# Altium footprint library Horizont_11_12_2017.PcbLib: 257 footprints (part 6 of 17)
Each footprint in its own frame and in the unit in brackets; x right, y up, seen from the top. Pads: shape width x height; smd on the part's side, far side on the other; paste and mask are expansions set on the pad; w line width, h text height; cw(c..) or ccw(c..) is an arc to the next point about the centre after c.
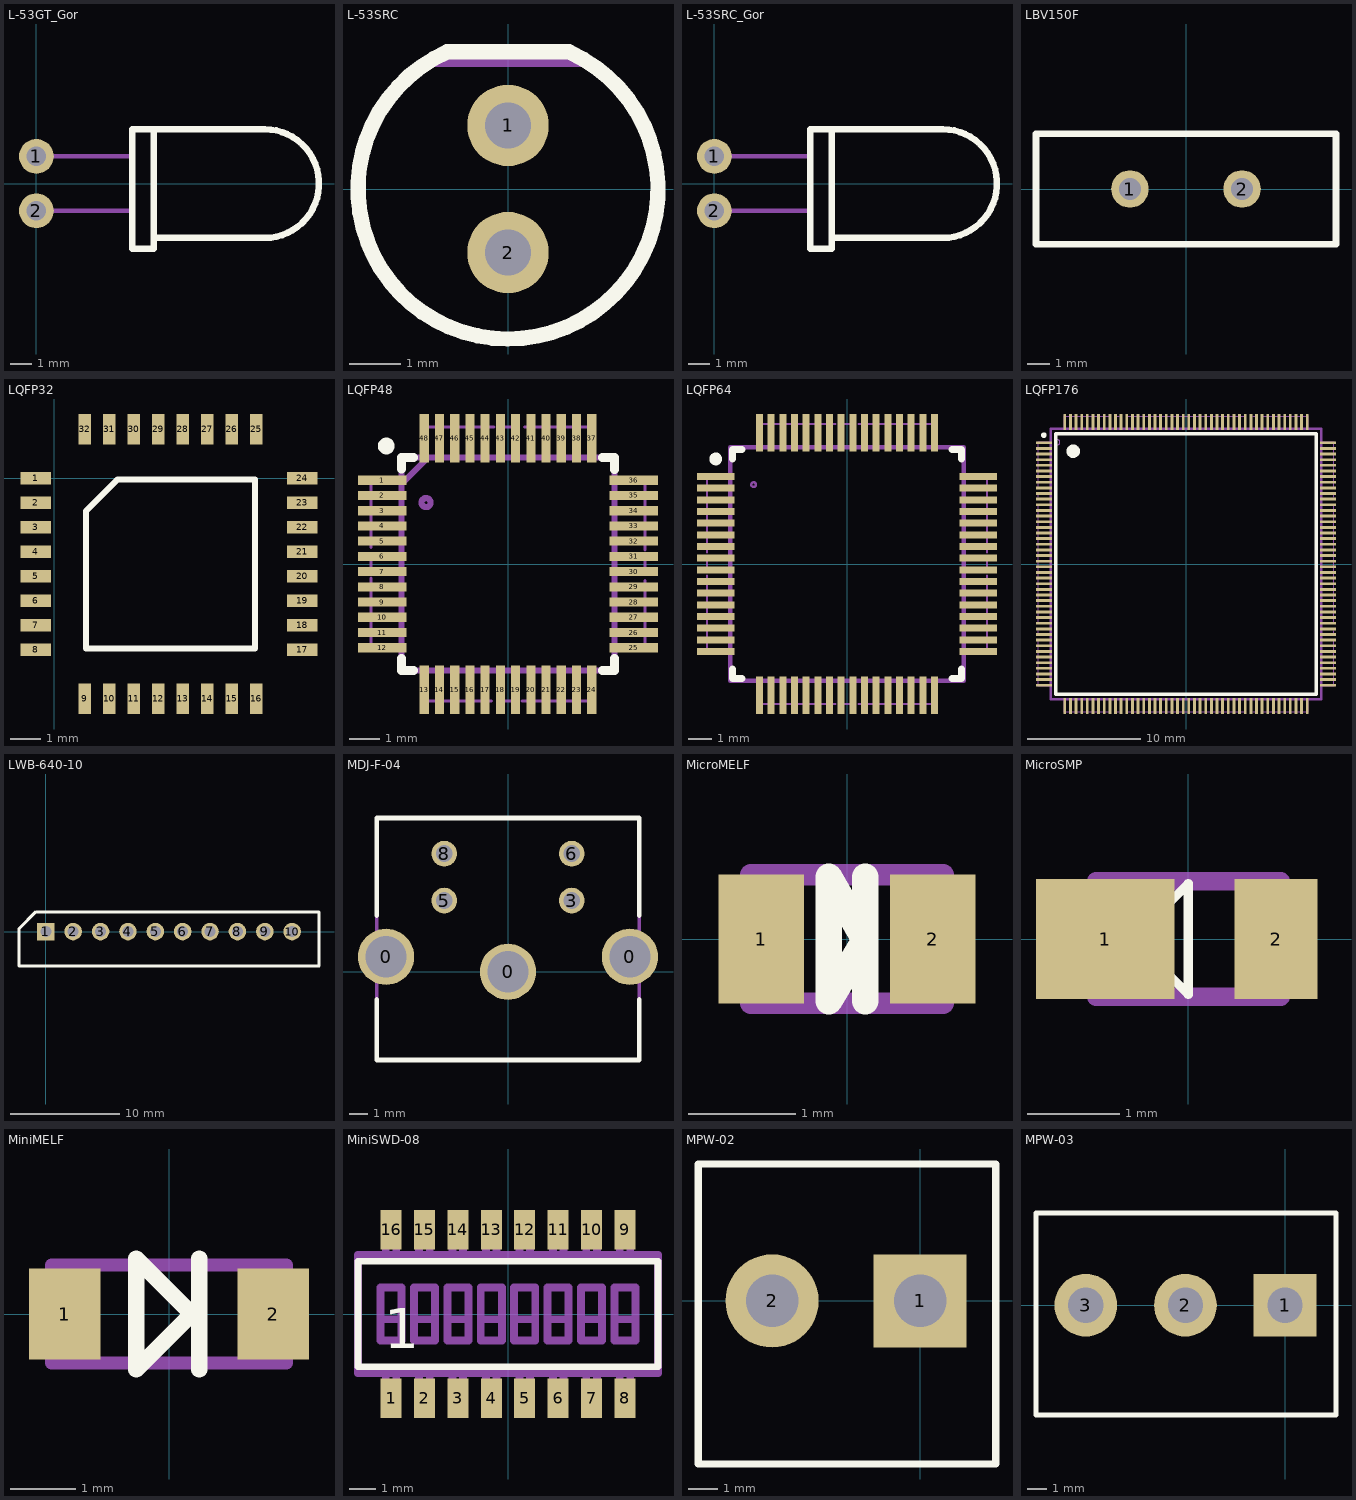
[diagram p5: the footprints below, top view; thin cyan lines are the x and y axes]

## L-53GT_Gor [mm]
height 6
pads (2):
  round 1.6 hole 0.9 unplated: 1(0,1.25) 2(0,-1.25)
Top Overlay:
  lines w0.3: 4.4,-1.3 4.4,-1.25 ; 5.4,-2.5 5.4,2.5 ; 5.4,-2.5 10.5,-2.5 ccw(c10.5,0) 10.5,2.5 5.4,2.5 ; 5.4,-2.5 5.4,-3 4.4,-3 4.4,2.5 5.4,2.5
Mechanical 1:
  lines w0.2: 0,-1.25 4.4,-1.25 4.4,-1.3 ; 0,1.25 4.4,1.25 ; 5.4,-2.5 5.4,-3 4.4,-3 4.4,2.5 5.4,2.5 ; 5.4,-2.5 10.5,-2.5 ccw(c10.5,0) 10.5,2.5 5.4,2.5 ; 5.4,-2.5 5.4,2.5
  text "+" at 3.2,-2.5 h1.5
  text ".Designator" at 6.5,-0.5 h1.5
3D body "L-53SGT_gor.stp": height 5.95, standoff -2.95, extent -0.25,-2.5 13.1,2.95

## L-53SRC [mm]
height 11
pads (2):
  round 1.6 hole 0.9 unplated: 1(0,1.25) 2(0,-1.25)
Top Overlay:
  lines w0.3: -1.2,2.7 1.2,2.7 ; -1.198,2.696 ccw(c0,0) 1.217,2.687
Mechanical 1:
  lines w0.2: -1.608,2.473 ccw(c0,0) 1.608,2.473 ; -1.608,2.5 1.608,2.5
  text ".Designator" at -3.2,3.55 h1.5
  text "+" at -0.4,-1.7 h1.5
3D body "L-53SRC.stp": height 11.2, standoff -3, extent -2.949,-2.95 2.949,2.5

## L-53SRC_Gor [mm]
height 6
pads (2):
  round 1.6 hole 0.9 unplated: 1(0,1.25) 2(0,-1.25)
Top Overlay:
  lines w0.3: 4.4,-1.3 4.4,-1.25 ; 5.4,-2.5 5.4,2.5 ; 5.4,-2.5 10.5,-2.5 ccw(c10.5,0) 10.5,2.5 5.4,2.5 ; 5.4,-2.5 5.4,-3 4.4,-3 4.4,2.5 5.4,2.5
Mechanical 1:
  lines w0.2: 0,-1.25 4.4,-1.25 4.4,-1.3 ; 0,1.25 4.4,1.25 ; 5.4,-2.5 5.4,-3 4.4,-3 4.4,2.5 5.4,2.5 ; 5.4,-2.5 10.5,-2.5 ccw(c10.5,0) 10.5,2.5 5.4,2.5 ; 5.4,-2.5 5.4,2.5
  text "+" at 3.2,-2.5 h1.5
  text ".Designator" at 6.5,-0.5 h1.5
3D body "L-53SRC_gor.stp": height 5.95, standoff -2.95, extent -0.25,-2.5 13.1,2.95

## LBV150F [mm]
height 14.5
pads (2):
  round 1.7 hole 1: 1(-2.54,0) 2(2.54,0)
Top Overlay:
  lines w0.3: -6.8,-2.5 6.8,-2.5 6.8,2.5 -6.8,2.5 -6.8,-2.5
Mechanical 1:
  circle w0.1: c-2.55,-0.25 r0.1
  lines w0.254: -6.8,-2.5 6.8,-2.5 6.8,2.5 -6.8,2.5 -6.8,-2.5
  text ".Designator" at -1.75,-0.4 h1.5
3D body "LBV150F.stp": height 13.5, standoff -3, extent -6.75,-2.5 6.75,2.5

## LQFP32 [mm]
pads (32):
  rect 1x0.4 smd: 1(-0.6,0) 2(-0.6,-0.8) 3(-0.6,-1.6) 4(-0.6,-2.4) 5(-0.6,-3.2) 6(-0.6,-4) 7(-0.6,-4.8) 8(-0.6,-5.6) 17(8.1,-5.6) 18(8.1,-4.8) 19(8.1,-4) 20(8.1,-3.2) 21(8.1,-2.4) 22(8.1,-1.6) 23(8.1,-0.8) 24(8.1,0)
  rect 0.4x1 smd: 9(1,-7.2) 10(1.8,-7.2) 11(2.6,-7.2) 12(3.4,-7.2) 13(4.2,-7.2) 14(5,-7.2) 15(5.8,-7.2) 16(6.6,-7.2) 25(6.6,1.6) 26(5.8,1.6) 27(5,1.6) 28(4.2,1.6) 29(3.4,1.6) 30(2.6,1.6) 31(1.8,1.6) 32(1,1.6)
Top Overlay:
  lines w0.2: 1.035,-5.565 6.565,-5.565 6.565,-0.035 2.07,-0.035 1.035,-1.07 1.035,-5.565
3D body "User Library-sot358-1.STEP": height 1.73, standoff 0.27, extent -0.739,-7.334 8.339,1.744

## LQFP48 [mm]
height 1.6
pads (48):
  rect 1.6x0.3 smd: 1(-4.125,2.75) 2(-4.125,2.25) 3(-4.125,1.75) 4(-4.125,1.25) 5(-4.125,0.75) 6(-4.125,0.25) 7(-4.125,-0.25) 8(-4.125,-0.75) 9(-4.125,-1.25) 10(-4.125,-1.75) 11(-4.125,-2.25) 12(-4.125,-2.75) 25(4.125,-2.75) 26(4.125,-2.25) 27(4.125,-1.75) 28(4.125,-1.25) 29(4.125,-0.75) 30(4.125,-0.25) 31(4.125,0.25) 32(4.125,0.75) 33(4.125,1.25) 34(4.125,1.75) 35(4.125,2.25) 36(4.125,2.75)
  rect 0.3x1.6 smd: 13(-2.75,-4.125) 14(-2.25,-4.125) 15(-1.75,-4.125) 16(-1.25,-4.125) 17(-0.75,-4.125) 18(-0.25,-4.125) 19(0.25,-4.125) 20(0.75,-4.125) 21(1.25,-4.125) 22(1.75,-4.125) 23(2.25,-4.125) 24(2.75,-4.125) 37(2.75,4.125) 38(2.25,4.125) 39(1.75,4.125) 40(1.25,4.125) 41(0.75,4.125) 42(0.25,4.125) 43(-0.25,4.125) 44(-0.75,4.125) 45(-1.25,4.125) 46(-1.75,4.125) 47(-2.25,4.125) 48(-2.75,4.125)
Top Overlay:
  circle w0.3: c-4,3.875 r0.125
  lines w0.3: -3.5,-3.1 -3.5,-3.5 -3.1,-3.5 ; -3.5,3.125 -3.5,3.5 -3.1,3.5 ; 3.1,-3.5 3.5,-3.5 3.5,-3.1 ; 3.1,3.5 3.5,3.5 3.5,3.1
Mechanical 1:
  circle w0.2: c-2.69,2.016 r0.15
  lines w0.1: -4.5,-2.75 -4.5,-0.46 ; -4.5,-0.085 -4.5,0.165 ; -4.5,0.54 -4.5,2.75 ; -2.75,-4.5 -0.54,-4.5 ; -2.75,4.5 -0.46,4.5 ; -0.165,-4.5 0.085,-4.5 ; -0.085,4.5 0.165,4.5 ; 0.46,-4.5 2.75,-4.5 ; 0.54,4.5 2.75,4.5 ; 4.5,-2.75 4.5,-0.54 ; 4.5,-0.165 4.5,0.085 ; 4.5,0.46 4.5,2.75
  lines w0.2: -4.5,-2.75 -3.5,-2.75 ; -4.5,2.75 -3.5,2.75 ; -3.5,-0.1 -3.5,0.1 ; -3.5,2.625 -2.75,3.375 ; -2.75,-4.5 -2.75,-3.5 ; -2.75,3.5 -2.75,4.5 ; 2.75,-4.5 2.75,-3.5 ; 2.75,3.5 2.75,4.5 ; 3.5,-2.75 4.5,-2.75 ; 3.5,2.75 4.5,2.75 ; -3.5,-3.5 3.5,-3.5 3.5,3.5 -3.5,3.5 -3.5,-3.5
  text ".Comment" at -2.33,-1.3 h1.5
  text ".Designator" at -1.625,0.625 h1.5
  text "48" at -2.413,2.159 h1.5
3D body "LQFP48.STEP": height 1.46, standoff -0.04, extent -4.5,-4.5 4.5,4.5

## LQFP64 [mm]
height 1.6
pads (64):
  rect 1.6x0.3 smd: 1(-5.625,3.75) 2(-5.625,3.25) 3(-5.625,2.75) 4(-5.625,2.25) 5(-5.625,1.75) 6(-5.625,1.25) 7(-5.625,0.75) 8(-5.625,0.25) 9(-5.625,-0.25) 10(-5.625,-0.75) 11(-5.625,-1.25) 12(-5.625,-1.75) 13(-5.625,-2.25) 14(-5.625,-2.75) 15(-5.625,-3.25) 16(-5.625,-3.75) 33(5.625,-3.75) 34(5.625,-3.25) 35(5.625,-2.75) 36(5.625,-2.25) 37(5.625,-1.75) 38(5.625,-1.25) 39(5.625,-0.75) 40(5.625,-0.25) 41(5.625,0.25) 42(5.625,0.75) 43(5.625,1.25) 44(5.625,1.75) 45(5.625,2.25) 46(5.625,2.75) 47(5.625,3.25) 48(5.625,3.75)
  rect 0.3x1.6 smd: 17(-3.75,-5.625) 18(-3.25,-5.625) 19(-2.75,-5.625) 20(-2.25,-5.625) 21(-1.75,-5.625) 22(-1.25,-5.625) 23(-0.75,-5.625) 24(-0.25,-5.625) 25(0.25,-5.625) 26(0.75,-5.625) 27(1.25,-5.625) 28(1.75,-5.625) 29(2.25,-5.625) 30(2.75,-5.625) 31(3.25,-5.625) 32(3.75,-5.625) 49(3.75,5.625) 50(3.25,5.625) 51(2.75,5.625) 52(2.25,5.625) 53(1.75,5.625) 54(1.25,5.625) 55(0.75,5.625) 56(0.25,5.625) 57(-0.25,5.625) 58(-0.75,5.625) 59(-1.25,5.625) 60(-1.75,5.625) 61(-2.25,5.625) 62(-2.75,5.625) 63(-3.25,5.625) 64(-3.75,5.625)
Top Overlay:
  circle w0.3: c-5.625,4.5 r0.125
  lines w0.3: -4.9,-4.5 -4.9,-4.9 -4.5,-4.9 ; -4.9,4.5 -4.9,4.9 -4.5,4.9 ; 4.5,-4.9 4.9,-4.9 4.9,-4.5 ; 4.5,4.9 4.9,4.9 4.9,4.5
Mechanical 1:
  circle w0.1: c-4,3.4 r0.1
  lines w0.1: -6,-3.75 -6,-0.5 ; -6,-0.125 -6,0.125 ; -6,0.5 -6,3.75 ; -3.75,-6 -0.5,-6 ; -3.75,6 -0.5,6 ; -0.125,-6 0.125,-6 ; -0.125,6 0.125,6 ; 0.5,-6 3.75,-6 ; 0.5,6 3.75,6 ; 6,-3.75 6,-0.5 ; 6,-0.125 6,0.125 ; 6,0.5 6,3.75
  lines w0.2: -6,-3.75 -5,-3.75 ; -6,3.75 -5,3.75 ; -3.75,-6 -3.75,-5 ; -3.75,5 -3.75,6 ; 3.75,-6 3.75,-5 ; 3.75,5 3.75,6 ; 5,-3.75 6,-3.75 ; 5,3.75 6,3.75 ; -5,-5 -5,5 5,5 5,-5 -5,-5
  text ".Designator" at -1.49,0.65 h1.5
  text ".Comment" at -3.08,-1.05 h1.5
  text "64" at -3.429,3.429 h1.5
3D body "S-PQFP-G64h1_45.stp": height 1.47, standoff 0, extent -6,-6 6,6

## LQFP176 [mm]
height 1.6
pads (176):
  rect 1.4x0.25 smd: 1(-12.6,10.75) 2(-12.6,10.25) 3(-12.6,9.75) 4(-12.6,9.25) 5(-12.6,8.75) 6(-12.6,8.25) 7(-12.6,7.75) 8(-12.6,7.25) 9(-12.6,6.75) 10(-12.6,6.25) 11(-12.6,5.75) 12(-12.6,5.25) 13(-12.6,4.75) 14(-12.6,4.25) 15(-12.6,3.75) 16(-12.6,3.25) 17(-12.6,2.75) 18(-12.6,2.25) 19(-12.6,1.75) 20(-12.6,1.25) 21(-12.6,0.75) 22(-12.6,0.25) 23(-12.6,-0.25) 24(-12.6,-0.75) 25(-12.6,-1.25) 26(-12.6,-1.75) 27(-12.6,-2.25) 28(-12.6,-2.75) 29(-12.6,-3.25) 30(-12.6,-3.75) 31(-12.6,-4.25) 32(-12.6,-4.75) 33(-12.6,-5.25) 34(-12.6,-5.75) 35(-12.6,-6.25) 36(-12.6,-6.75) 37(-12.6,-7.25) 38(-12.6,-7.75) 39(-12.6,-8.25) 40(-12.6,-8.75) 41(-12.6,-9.25) 42(-12.6,-9.75) 43(-12.6,-10.25) 44(-12.6,-10.75) 89(12.6,-10.75) 90(12.6,-10.25) 91(12.6,-9.75) 92(12.6,-9.25) 93(12.6,-8.75) 94(12.6,-8.25) 95(12.6,-7.75) 96(12.6,-7.25) 97(12.6,-6.75) 98(12.6,-6.25) 99(12.6,-5.75) 100(12.6,-5.25) 101(12.6,-4.75) 102(12.6,-4.25) 103(12.6,-3.75) 104(12.6,-3.25) 105(12.6,-2.75) 106(12.6,-2.25) 107(12.6,-1.75) 108(12.6,-1.25) 109(12.6,-0.75) 110(12.6,-0.25) 111(12.6,0.25) 112(12.6,0.75) 113(12.6,1.25) 114(12.6,1.75) 115(12.6,2.25) 116(12.6,2.75) 117(12.6,3.25) 118(12.6,3.75) 119(12.6,4.25) 120(12.6,4.75) 121(12.6,5.25) 122(12.6,5.75) 123(12.6,6.25) 124(12.6,6.75) 125(12.6,7.25) 126(12.6,7.75) 127(12.6,8.25) 128(12.6,8.75) 129(12.6,9.25) 130(12.6,9.75) 131(12.6,10.25) 132(12.6,10.75)
  rect 0.25x1.4 smd: 45(-10.75,-12.6) 46(-10.25,-12.6) 47(-9.75,-12.6) 48(-9.25,-12.6) 49(-8.75,-12.6) 50(-8.25,-12.6) 51(-7.75,-12.6) 52(-7.25,-12.6) 53(-6.75,-12.6) 54(-6.25,-12.6) 55(-5.75,-12.6) 56(-5.25,-12.6) 57(-4.75,-12.6) 58(-4.25,-12.6) 59(-3.75,-12.6) 60(-3.25,-12.6) 61(-2.75,-12.6) 62(-2.25,-12.6) 63(-1.75,-12.6) 64(-1.25,-12.6) 65(-0.75,-12.6) 66(-0.25,-12.6) 67(0.25,-12.6) 68(0.75,-12.6) 69(1.25,-12.6) 70(1.75,-12.6) 71(2.25,-12.6) 72(2.75,-12.6) 73(3.25,-12.6) 74(3.75,-12.6) 75(4.25,-12.6) 76(4.75,-12.6) 77(5.25,-12.6) 78(5.75,-12.6) 79(6.25,-12.6) 80(6.75,-12.6) 81(7.25,-12.6) 82(7.75,-12.6) 83(8.25,-12.6) 84(8.75,-12.6) 85(9.25,-12.6) 86(9.75,-12.6) 87(10.25,-12.6) 88(10.75,-12.6) 133(10.75,12.6) 134(10.25,12.6) 135(9.75,12.6) 136(9.25,12.6) 137(8.75,12.6) 138(8.25,12.6) 139(7.75,12.6) 140(7.25,12.6) 141(6.75,12.6) 142(6.25,12.6) 143(5.75,12.6) 144(5.25,12.6) 145(4.75,12.6) 146(4.25,12.6) 147(3.75,12.6) 148(3.25,12.6) 149(2.75,12.6) 150(2.25,12.6) 151(1.75,12.6) 152(1.25,12.6) 153(0.75,12.6) 154(0.25,12.6) 155(-0.25,12.6) 156(-0.75,12.6) 157(-1.25,12.6) 158(-1.75,12.6) 159(-2.25,12.6) 160(-2.75,12.6) 161(-3.25,12.6) 162(-3.75,12.6) 163(-4.25,12.6) 164(-4.75,12.6) 165(-5.25,12.6) 166(-5.75,12.6) 167(-6.25,12.6) 168(-6.75,12.6) 169(-7.25,12.6) 170(-7.75,12.6) 171(-8.25,12.6) 172(-8.75,12.6) 173(-9.25,12.6) 174(-9.75,12.6) 175(-10.25,12.6) 176(-10.75,12.6)
Top Overlay:
  circle w0.6: c-10,10 r0.3
  circle w0.25: c-12.6,11.425 r0.125
  lines w0.3: -11.557,-11.557 11.557,-11.557 11.557,11.557 -11.557,11.557 -11.557,-11.557
Mechanical 1:
  circle w0.1: c-11.404,10.795 r0.228
  lines w0.1: -13.1,-10.75 -13.1,-6.8 ; -13.1,-6.1 -13.1,-5.9 ; -13.1,-5.2 -13.1,5.2 ; -13.1,5.9 -13.1,6.1 ; -13.1,6.8 -13.1,10.75 ; -10.75,-13.1 -6.8,-13.1 ; -10.75,13.1 -6.8,13.1 ; -6.1,-13.1 -5.9,-13.1 ; -6.1,13.1 -5.9,13.1 ; -5.2,-13.1 5.2,-13.1 ; -5.2,13.1 5.2,13.1 ; 5.9,-13.1 6.1,-13.1 ; 5.9,13.1 6.1,13.1 ; 6.8,-13.1 10.75,-13.1 ; 6.8,13.1 10.75,13.1 ; 13.1,-10.75 13.1,-6.8 ; 13.1,-6.1 13.1,-5.9 ; 13.1,-5.2 13.1,5.2 ; 13.1,5.9 13.1,6.1 ; 13.1,6.8 13.1,10.75
  lines w0.2: -13.1,-10.75 -12,-10.75 ; -13.1,10.75 -12,10.75 ; -10.75,-13.1 -10.75,-12 ; -10.75,12 -10.75,13.1 ; 10.75,-13.1 10.75,-12 ; 10.75,12 10.75,13.1 ; 12,-10.75 13.1,-10.75 ; 12,10.75 13.1,10.75 ; -12,-12 12,-12 12,12 -12,12 -12,-12
  text "176" at -10.541,10.668 h1.5
  text ".Designator" at -2.34,0.989 h1.5
3D body "LQFP176h16.stp": height 1.62, standoff 0, extent -13,-13 13,13

## LWB-640-10 [mm]
height 6
pads (10):
  rect 1.6x1.6 hole 1: 1(0,0)
  round 1.6 hole 1: 2(2.5,0) 3(5,0) 4(7.5,0) 5(10,0) 6(12.5,0) 7(15,0) 8(17.5,0) 9(20,0) 10(22.5,0)
Top Overlay:
  lines w0.3: 24.95,-3.15 -2.45,-3.15 -2.45,0.25 -0.9,1.8 24.95,1.8 24.95,-3.15 ; 24.95,-3.15 24.95,-3.15
Mechanical 1:
  lines w0.2: -2.45,-3.15 24.95,-3.15 24.95,1.8 -0.9,1.8 -2.45,0.25 -2.45,-3.15
  text "10" at 21.875,-0.625 h1.5
  text "1" at 0,-0.625 h1.5
  text ".Designator" at 9.4,2.45 h1.5
3D body "LWB-640-10.stp": height 6, standoff -3.5, extent -2.45,-3.15 24.95,1.8

## MDJ-F-04 [mm]
height 13
pads (7):
  round 3 hole 2.2: 0(-6.5,0.8) 0(0,0) 0(6.5,0.8)
  round 1.372 hole 0.9 mask+0.051: 3(3.4,3.8) 5(-3.4,3.8) 6(3.4,6.3) 8(-3.4,6.3)
Top Overlay:
  lines w0.25: -7.002,-1.475 -7.002,-4.7 6.998,-4.7 6.998,-1.475 ; -7.002,3.002 -7.002,8.2 6.998,8.2 6.998,3.002
Mechanical 1:
  lines w0.2: -7.002,-4.7 6.998,-4.7 6.998,8.2 -7.002,8.2 -7.002,-4.7
  text "5" at -3.55,3.35 h1.5
  text "8" at -3.55,5.85 h1.5
  text "6" at 3.25,5.85 h1.5
  text "3" at 3.25,3.35 h1.5
  text ".Designator" at -2.3,-3.2 h1.5
3D body "MDJ-F-04.stp": height 13, standoff -3.5, extent -7,-4.7 7,8.2

## MicroMELF [mm]
height 1.2
pads (2):
  rect 0.8x1.2 smd: 1(-0.8,0) 2(0.8,0)
Top Overlay:
  lines w0.25: 0.17,-0.58 0.17,0.58 ; -0.17,-0.58 0.17,-0.01 -0.17,0.58 -0.17,-0.58
Mechanical 1:
  lines w0.2: -0.9,-0.6 0.9,-0.6 0.9,0.6 -0.9,0.6 -0.9,-0.6
  text ".Designator" at -0.9,1.08 h1.5
  text "+" at -1.5,-1.3 h1.5
3D body "MicroMELF.step.stp": height 1.2, standoff 0, extent -0.9,-0.599 0.9,0.599

## MicroSMP [mm]
height 1
pads (2):
  rect 1.5x1.3 smd: 1(-0.9,0)
  rect 0.9x1.3 smd: 2(0.95,0)
Top Overlay:
  lines w0.1: -0.6,-0.6 -0.6,0.6 ; -0.6,0 0,0.6 0,-0.6 -0.6,0
Mechanical 1:
  circle w0.1: c-0.6,0 r0.1
  lines w0.2: -1,-0.625 -1,0.625 1,0.625 1,-0.625 -1,-0.625
  text ".Designator" at -0.87,0.95 h1.5
3D body: height 0.5, standoff 0.1, extent -1.4,-0.7 1.2,0.7
3D body: height 0.55, standoff 0.1, extent -1.2,-0.6 -1,0.6

## MiniMELF [mm]
height 1.5
pads (2):
  rect 1.1x1.4 smd: 1(-1.6,0) 2(1.6,0)
Top Overlay:
  lines w0.25: 0.462,-0.85 0.462,0.85 ; 0.35,0 0.45,0 0.35,0 ; 0.35,0 -0.5,0.85 -0.5,-0.85 0.35,0
Mechanical 1:
  lines w0.2: -1.8,-0.75 1.8,-0.75 1.8,0.75 -1.8,0.75 -1.8,-0.75
  text "+" at -1.4,-0.5 h1.5
  text ".Designator" at -1,1.6 h1.5
3D body "MiniMelf.STEP": height 1.5, standoff 0, extent -1.75,-0.75 1.75,0.75

## MiniSWD-08 [mm]
height 1.5
pads (16):
  rect 0.8x1.5 smd: 1(-4.445,-3.2) 2(-3.175,-3.2) 3(-1.905,-3.2) 4(-0.635,-3.2) 5(0.635,-3.2) 6(1.905,-3.2) 7(3.175,-3.2) 8(4.445,-3.2) 9(4.445,3.2) 10(3.175,3.2) 11(1.905,3.2) 12(0.635,3.2) 13(-0.635,3.2) 14(-1.905,3.2) 15(-3.175,3.2) 16(-4.445,3.2)
Top Overlay:
  lines w0.25: -5.7,-2 5.7,-2 5.7,2 -5.7,2 -5.7,-2
  text "1" at -4.7,-1.3 h1.52
Mechanical 1:
  lines w0.3: -4.845,-0.2 -4.045,-0.2 ; -4.645,-2.25 -4.645,-3.35 -4.245,-3.35 -4.245,-2.25 ; -4.645,2.25 -4.645,3.35 -4.245,3.35 -4.245,2.25 ; -3.575,-0.2 -2.775,-0.2 ; -3.375,-2.25 -3.375,-3.35 -2.975,-3.35 -2.975,-2.25 ; -3.375,2.25 -3.375,3.35 -2.975,3.35 -2.975,2.25 ; -2.305,-0.2 -1.505,-0.2 ; -2.105,-2.25 -2.105,-3.35 -1.705,-3.35 -1.705,-2.25 ; -2.105,2.25 -2.105,3.35 -1.705,3.35 -1.705,2.25 ; -1.035,-0.2 -0.235,-0.2 ; -0.835,-2.25 -0.835,-3.35 -0.435,-3.35 -0.435,-2.25 ; -0.835,2.25 -0.835,3.35 -0.435,3.35 -0.435,2.25 ; 0.235,-0.2 1.035,-0.2 ; 0.435,-2.25 0.435,-3.35 0.835,-3.35 0.835,-2.25 ; 0.435,2.25 0.435,3.35 0.835,3.35 0.835,2.25 ; 1.505,-0.2 2.305,-0.2 ; 1.705,-2.25 1.705,-3.35 2.105,-3.35 2.105,-2.25 ; 1.705,2.25 1.705,3.35 2.105,3.35 2.105,2.25 ; 2.775,-0.2 3.575,-0.2 ; 2.975,-2.25 2.975,-3.35 3.375,-3.35 3.375,-2.25 ; 2.975,2.25 2.975,3.35 3.375,3.35 3.375,2.25 ; 4.045,-0.2 4.845,-0.2 ; 4.245,-2.25 4.245,-3.35 4.645,-3.35 4.645,-2.25 ; 4.245,2.25 4.245,3.35 4.645,3.35 4.645,2.25 ; -5.7,-2.25 5.7,-2.25 5.7,2.25 -5.7,2.25 -5.7,-2.25 ; -4.845,-1 -4.845,1 -4.045,1 -4.045,-1 -4.845,-1 ; -3.575,-1 -3.575,1 -2.775,1 -2.775,-1 -3.575,-1 ; -2.305,-1 -2.305,1 -1.505,1 -1.505,-1 -2.305,-1 ; -1.035,-1 -1.035,1 -0.235,1 -0.235,-1 -1.035,-1 ; 0.235,-1 0.235,1 1.035,1 1.035,-1 0.235,-1 ; 1.505,-1 1.505,1 2.305,1 2.305,-1 1.505,-1 ; 2.775,-1 2.775,1 3.575,1 3.575,-1 2.775,-1 ; 4.045,-1 4.045,1 4.845,1 4.845,-1 4.045,-1
3D body "MiniSWD-08.STEP": height 1.5, standoff 0, extent -5.7,-3.35 5.7,3.35

## MPW-02 [mm]
height 13.9
pads (2):
  rect 3.2x3.2 hole 1.8: 1(0,0)
  round 3.2 hole 1.8: 2(-5.08,0)
Top Overlay:
  lines w0.25: -7.62,-5.6 -7.62,4.7 2.6,4.7 2.6,-5.6 -7.62,-5.6
Mechanical 1:
  lines w0.2: -7.62,-5.6 2.6,-5.6 2.6,4.7 -7.62,4.7 -7.62,-5.6
  text "2" at -5.334,-0.254 h1.5
  text "1" at 0,-0.5 h1.5
  text ".Designator" at -4.445,3.048 h1.5
3D body "MPW-02.stp": height 13.7, standoff -3.3, extent -7.65,-5.57 2.57,4.63

## MPW-03 [mm]
height 13.9
pads (3):
  rect 3.2x3.2 hole 1.8: 1(0,0)
  round 3.2 hole 1.8: 2(-5.08,0) 3(-10.16,0)
Top Overlay:
  lines w0.25: -12.7,-5.6 2.6,-5.6 2.6,4.7 -12.7,4.7 -12.7,-5.6
Mechanical 1:
  lines w0.2: -12.7,-5.6 -12.7,4.7 2.6,4.7 2.6,-5.6 -12.7,-5.6
  text ".Designator" at -7.62,3.175 h1.5
  text "1" at 0,-0.5 h1.5
  text "3" at -10.3,-0.35 h1.5
3D body "MPW-03.stp": height 13.7, standoff -3.3, extent -12.73,-5.57 2.57,4.63